# Altium footprint library 4.49-接插件.PcbLib: 260 footprints (part 4 of 17)
Each footprint in its own frame and in the unit in brackets; x right, y up, seen from the top. Pads: shape width x height; smd on the part's side, far side on the other; paste and mask are expansions set on the pad; w line width, h text height; cw(c..) or ccw(c..) is an arc to the next point about the centre after c.
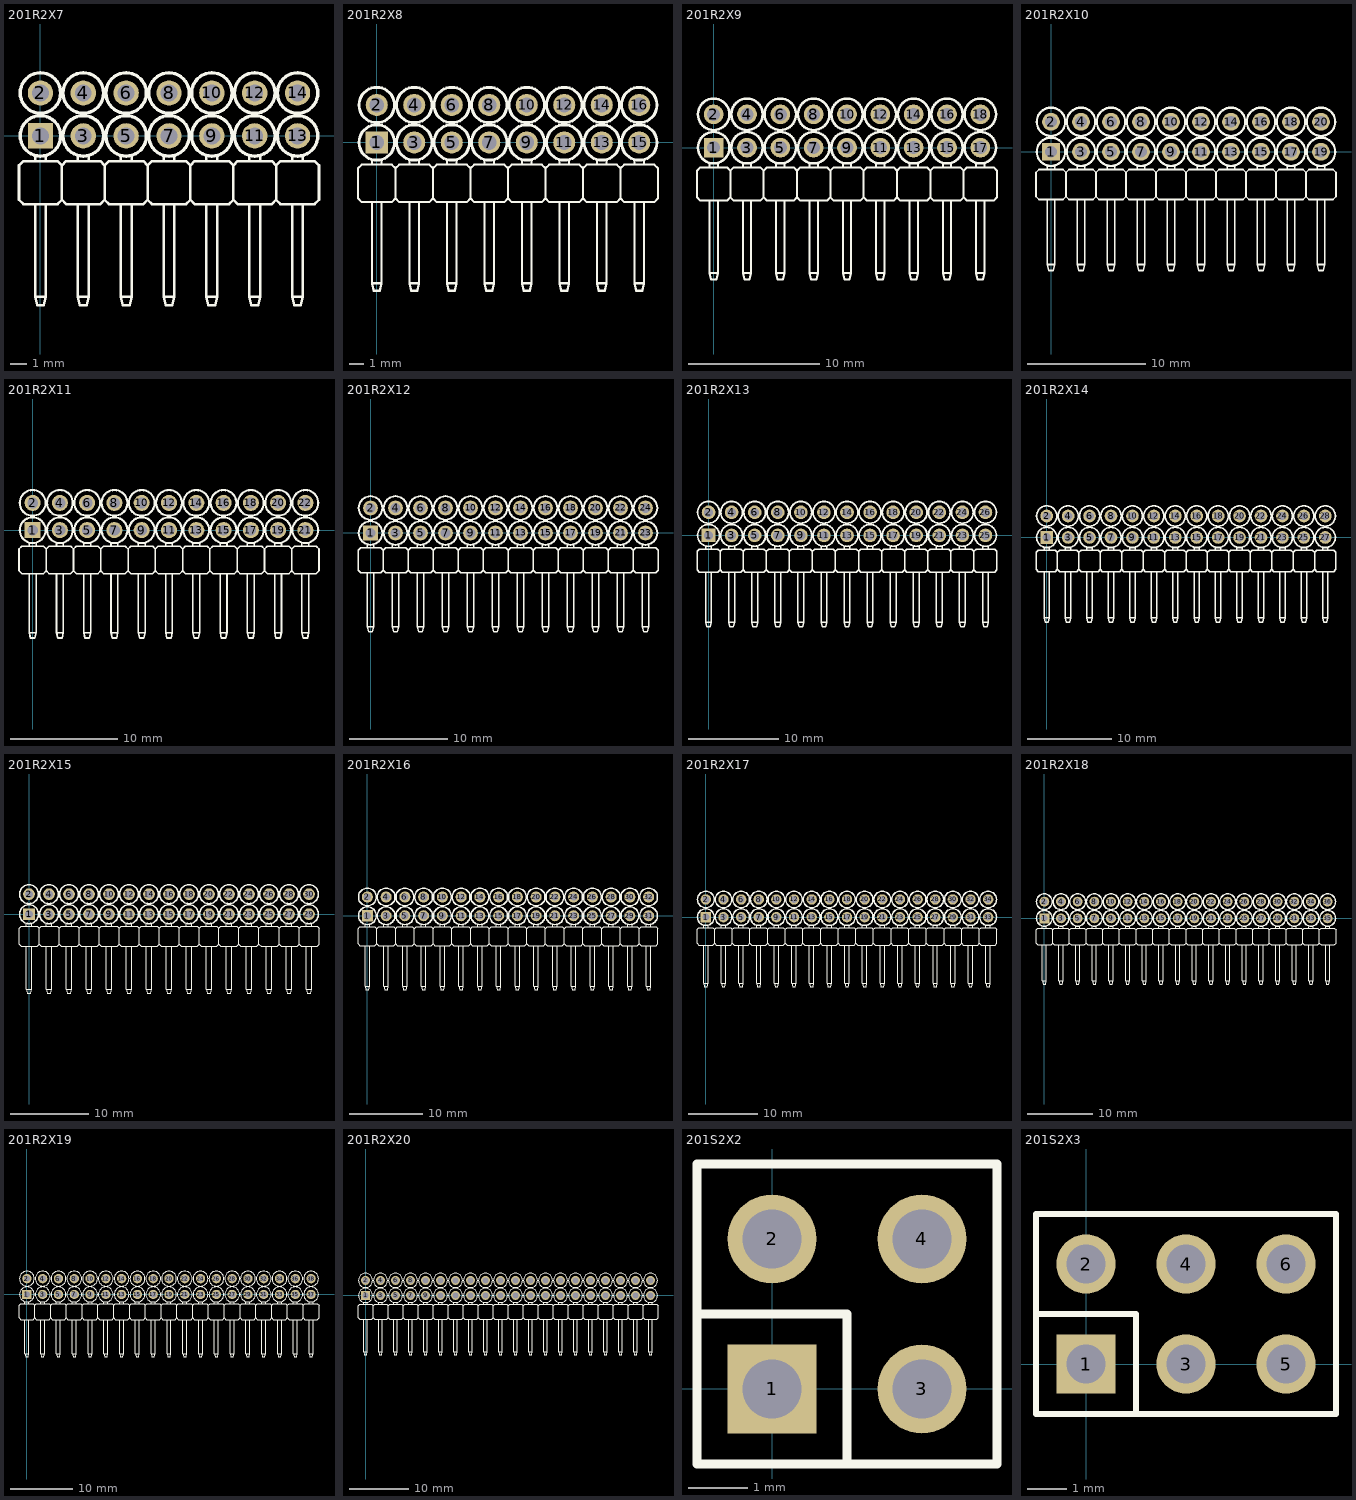
[diagram p3: the footprints below, top view; thin cyan lines are the x and y axes]

## 201R2X7 [mm]
pads (14):
  rect 1.5x1.5 hole 1: 1(0,0)
  round 1.5 hole 1: 2(0,2.54) 3(2.54,0) 4(2.54,2.54) 5(5.08,0) 6(5.08,2.54) 7(7.62,0) 8(7.62,2.54) 9(10.16,0) 10(10.16,2.54) 11(12.7,0) 12(12.7,2.54) 13(15.24,0) 14(15.24,2.54)
Top Overlay:
  circle w0.2: c15.24,2.54 r1.2
  circle w0.2: c15.24,0 r1.2
  circle w0.2: c12.7,0 r1.2
  circle w0.2: c12.7,2.54 r1.2
  circle w0.2: c10.16,2.54 r1.2
  circle w0.2: c10.16,0 r1.2
  circle w0.2: c7.62,0 r1.2
  circle w0.2: c2.54,0 r1.2
  circle w0.2: c0,0 r1.2
  circle w0.2: c5.08,0 r1.2
  circle w0.2: c5.08,2.54 r1.2
  circle w0.2: c0,2.54 r1.2
  circle w0.2: c2.54,2.54 r1.2
  circle w0.2: c7.62,2.54 r1.2
  lines w0.15: -0.32,-4.05 -0.32,-9.54 ; -0.32,-1.5 -0.32,-1.27 ; 0.32,-4.05 0.32,-9.54 ; 0.32,-1.5 0.32,-1.27 ; 2.22,-4.05 2.22,-9.54 ; 2.22,-1.5 2.22,-1.27 ; 2.86,-4.05 2.86,-9.54 ; 2.86,-1.5 2.86,-1.27 ; 4.76,-4.05 4.76,-9.54 ; 4.76,-1.5 4.76,-1.27 ; 5.4,-4.05 5.4,-9.54 ; 5.4,-1.5 5.4,-1.27 ; 7.3,-4.05 7.3,-9.54 ; 7.3,-1.5 7.3,-1.27 ; 7.94,-4.05 7.94,-9.54 ; 7.94,-1.5 7.94,-1.27 ; 9.84,-4.05 9.84,-9.54 ; 9.84,-1.5 9.84,-1.27 ; 10.48,-4.05 10.48,-9.54 ; 10.48,-1.5 10.48,-1.27 ; 12.38,-4.05 12.38,-9.54 ; 12.38,-1.5 12.38,-1.27 ; 13.02,-4.05 13.02,-9.54 ; 13.02,-1.5 13.02,-1.27 ; 14.92,-4.05 14.92,-9.54 ; 14.92,-1.5 14.92,-1.27 ; 15.56,-4.05 15.56,-9.54 ; 15.56,-1.5 15.56,-1.27 ; -0.32,-9.54 0.32,-9.54 ; -0.32,-9.54 -0.2,-10.04 0.2,-10.04 0.32,-9.54 ; 1.27,-3.786 1.27,-1.754 ; 1.27,-3.786 1.524,-4.04 3.556,-4.04 3.81,-3.786 ; 1.27,-3.786 1.016,-4.04 -1.016,-4.04 -1.27,-3.786 -1.27,-1.754 -1.016,-1.5 1.016,-1.5 1.27,-1.754 ; 1.27,-1.754 1.524,-1.5 3.556,-1.5 3.81,-1.754 ; 2.22,-9.54 2.34,-10.04 2.74,-10.04 2.86,-9.54 ; 2.22,-9.54 2.86,-9.54 ; 3.81,-3.786 4.064,-4.04 6.096,-4.04 6.35,-3.786 ; 3.81,-3.786 3.81,-1.754 ; 3.81,-1.754 4.064,-1.5 6.096,-1.5 6.35,-1.754 ; 4.76,-9.54 5.4,-9.54 ; 4.76,-9.54 4.88,-10.04 5.28,-10.04 5.4,-9.54 ; 6.35,-3.786 6.604,-4.04 8.636,-4.04 8.89,-3.786 ; 6.35,-3.786 6.35,-1.754 ; 6.35,-1.754 6.604,-1.5 8.636,-1.5 8.89,-1.754 ; 7.3,-9.54 7.94,-9.54 ; 7.3,-9.54 7.42,-10.04 7.82,-10.04 7.94,-9.54 ; 8.89,-3.786 8.89,-1.754 ; 8.89,-3.786 9.144,-4.04 11.176,-4.04 11.43,-3.786 ; 8.89,-1.754 9.144,-1.5 11.176,-1.5 11.43,-1.754 ; 9.84,-9.54 9.96,-10.04 10.36,-10.04 10.48,-9.54 ; 9.84,-9.54 10.48,-9.54 ; 11.43,-3.786 11.684,-4.04 13.716,-4.04 13.97,-3.786 ; 11.43,-3.786 11.43,-1.754 ; 11.43,-1.754 11.684,-1.5 13.716,-1.5 13.97,-1.754 ; 12.38,-9.54 13.02,-9.54 ; 12.38,-9.54 12.5,-10.04 12.9,-10.04 13.02,-9.54 ; 13.97,-3.786 14.224,-4.04 16.256,-4.04 16.51,-3.786 16.51,-1.754 16.256,-1.5 14.224,-1.5 13.97,-1.754 ; 13.97,-3.786 13.97,-1.754 ; 14.92,-9.54 15.56,-9.54 ; 14.92,-9.54 15.04,-10.04 15.44,-10.04 15.56,-9.54
3D body "201R7.STEP": height 5.08, standoff -1.73, extent -1.27,-10 16.51,2.855

## 201R2X8 [mm]
pads (16):
  rect 1.5x1.5 hole 1: 1(0,0)
  round 1.5 hole 1: 2(0,2.54) 3(2.54,0) 4(2.54,2.54) 5(5.08,0) 6(5.08,2.54) 7(7.62,0) 8(7.62,2.54) 9(10.16,0) 10(10.16,2.54) 11(12.7,0) 12(12.7,2.54) 13(15.24,0) 14(15.24,2.54) 15(17.78,0) 16(17.78,2.54)
Top Overlay:
  circle w0.2: c17.78,2.54 r1.2
  circle w0.2: c17.78,0 r1.2
  circle w0.2: c7.62,2.54 r1.2
  circle w0.2: c2.54,2.54 r1.2
  circle w0.2: c0,2.54 r1.2
  circle w0.2: c5.08,2.54 r1.2
  circle w0.2: c5.08,0 r1.2
  circle w0.2: c0,0 r1.2
  circle w0.2: c2.54,0 r1.2
  circle w0.2: c7.62,0 r1.2
  circle w0.2: c10.16,0 r1.2
  circle w0.2: c10.16,2.54 r1.2
  circle w0.2: c12.7,2.54 r1.2
  circle w0.2: c12.7,0 r1.2
  circle w0.2: c15.24,0 r1.2
  circle w0.2: c15.24,2.54 r1.2
  lines w0.15: -0.32,-4.05 -0.32,-9.54 ; -0.32,-1.5 -0.32,-1.27 ; 0.32,-4.05 0.32,-9.54 ; 0.32,-1.5 0.32,-1.27 ; 2.22,-4.05 2.22,-9.54 ; 2.22,-1.5 2.22,-1.27 ; 2.86,-4.05 2.86,-9.54 ; 2.86,-1.5 2.86,-1.27 ; 4.76,-4.05 4.76,-9.54 ; 4.76,-1.5 4.76,-1.27 ; 5.4,-4.05 5.4,-9.54 ; 5.4,-1.5 5.4,-1.27 ; 7.3,-4.05 7.3,-9.54 ; 7.3,-1.5 7.3,-1.27 ; 7.94,-4.05 7.94,-9.54 ; 7.94,-1.5 7.94,-1.27 ; 9.84,-4.05 9.84,-9.54 ; 9.84,-1.5 9.84,-1.27 ; 10.48,-4.05 10.48,-9.54 ; 10.48,-1.5 10.48,-1.27 ; 12.38,-4.05 12.38,-9.54 ; 12.38,-1.5 12.38,-1.27 ; 13.02,-4.05 13.02,-9.54 ; 13.02,-1.5 13.02,-1.27 ; 14.92,-4.05 14.92,-9.54 ; 14.92,-1.5 14.92,-1.27 ; 15.56,-4.05 15.56,-9.54 ; 15.56,-1.5 15.56,-1.27 ; 17.46,-4.05 17.46,-9.54 ; 17.46,-1.5 17.46,-1.27 ; 18.1,-4.05 18.1,-9.54 ; 18.1,-1.5 18.1,-1.27 ; -0.32,-9.54 -0.2,-10.04 0.2,-10.04 0.32,-9.54 ; -0.32,-9.54 0.32,-9.54 ; 1.27,-3.786 1.016,-4.04 -1.016,-4.04 -1.27,-3.786 -1.27,-1.754 -1.016,-1.5 1.016,-1.5 1.27,-1.754 ; 1.27,-3.786 1.524,-4.04 3.556,-4.04 3.81,-3.786 ; 1.27,-3.786 1.27,-1.754 ; 1.27,-1.754 1.524,-1.5 3.556,-1.5 3.81,-1.754 ; 2.22,-9.54 2.86,-9.54 ; 2.22,-9.54 2.34,-10.04 2.74,-10.04 2.86,-9.54 ; 3.81,-3.786 3.81,-1.754 ; 3.81,-3.786 4.064,-4.04 6.096,-4.04 6.35,-3.786 ; 3.81,-1.754 4.064,-1.5 6.096,-1.5 6.35,-1.754 ; 4.76,-9.54 4.88,-10.04 5.28,-10.04 5.4,-9.54 ; 4.76,-9.54 5.4,-9.54 ; 6.35,-3.786 6.35,-1.754 ; 6.35,-3.786 6.604,-4.04 8.636,-4.04 8.89,-3.786 ; 6.35,-1.754 6.604,-1.5 8.636,-1.5 8.89,-1.754 ; 7.3,-9.54 7.42,-10.04 7.82,-10.04 7.94,-9.54 ; 7.3,-9.54 7.94,-9.54 ; 8.89,-3.786 8.89,-1.754 ; 8.89,-3.786 9.144,-4.04 11.176,-4.04 11.43,-3.786 ; 8.89,-1.754 9.144,-1.5 11.176,-1.5 11.43,-1.754 ; 9.84,-9.54 9.96,-10.04 10.36,-10.04 10.48,-9.54 ; 9.84,-9.54 10.48,-9.54 ; 11.43,-3.786 11.684,-4.04 13.716,-4.04 13.97,-3.786 ; 11.43,-3.786 11.43,-1.754 ; 11.43,-1.754 11.684,-1.5 13.716,-1.5 13.97,-1.754 ; 12.38,-9.54 13.02,-9.54 ; 12.38,-9.54 12.5,-10.04 12.9,-10.04 13.02,-9.54 ; 13.97,-3.786 13.97,-1.754 ; 13.97,-3.786 14.224,-4.04 16.256,-4.04 16.51,-3.786 ; 13.97,-1.754 14.224,-1.5 16.256,-1.5 16.51,-1.754 ; 14.92,-9.54 15.04,-10.04 15.44,-10.04 15.56,-9.54 ; 14.92,-9.54 15.56,-9.54 ; 16.51,-3.786 16.51,-1.754 ; 16.51,-3.786 16.764,-4.04 18.796,-4.04 19.05,-3.786 19.05,-1.754 18.796,-1.5 16.764,-1.5 16.51,-1.754 ; 17.46,-9.54 17.58,-10.04 17.98,-10.04 18.1,-9.54 ; 17.46,-9.54 18.1,-9.54
3D body "201R8.STEP": height 5.08, standoff -1.73, extent -1.27,-10 19.05,2.855

## 201R2X9 [mm]
pads (18):
  rect 1.5x1.5 hole 1: 1(0,0)
  round 1.5 hole 1: 2(0,2.54) 3(2.54,0) 4(2.54,2.54) 5(5.08,0) 6(5.08,2.54) 7(7.62,0) 8(7.62,2.54) 9(10.16,0) 10(10.16,2.54) 11(12.7,0) 12(12.7,2.54) 13(15.24,0) 14(15.24,2.54) 15(17.78,0) 16(17.78,2.54) 17(20.32,0) 18(20.32,2.54)
Top Overlay:
  drawing of 154 lines, arcs and shapes, not listed
3D body "201R9.STEP": height 5.08, standoff -1.73, extent -1.27,-10 21.59,2.855

## 201R2X10 [mm]
pads (20):
  rect 1.5x1.5 hole 1: 1(0,0)
  round 1.5 hole 1: 2(0,2.54) 3(2.54,0) 4(2.54,2.54) 5(5.08,0) 6(5.08,2.54) 7(7.62,0) 8(7.62,2.54) 9(10.16,0) 10(10.16,2.54) 11(12.7,0) 12(12.7,2.54) 13(15.24,0) 14(15.24,2.54) 15(17.78,0) 16(17.78,2.54) 17(20.32,0) 18(20.32,2.54) 19(22.86,0) 20(22.86,2.54)
Top Overlay:
  drawing of 171 lines, arcs and shapes, not listed
3D body "201R10.STEP": height 5.08, standoff -1.73, extent -1.27,-10 24.13,2.855

## 201R2X11 [mm]
pads (22):
  rect 1.5x1.5 hole 1: 1(0,0)
  round 1.5 hole 1: 2(0,2.54) 3(2.54,0) 4(2.54,2.54) 5(5.08,0) 6(5.08,2.54) 7(7.62,0) 8(7.62,2.54) 9(10.16,0) 10(10.16,2.54) 11(12.7,0) 12(12.7,2.54) 13(15.24,0) 14(15.24,2.54) 15(17.78,0) 16(17.78,2.54) 17(20.32,0) 18(20.32,2.54) 19(22.86,0) 20(22.86,2.54) 21(25.4,0) 22(25.4,2.54)
Top Overlay:
  drawing of 188 lines, arcs and shapes, not listed
3D body "201R11.STEP": height 5.08, standoff -1.73, extent -1.27,-10 26.67,2.855

## 201R2X12 [mm]
pads (24):
  rect 1.5x1.5 hole 1: 1(0,0)
  round 1.5 hole 1: 2(0,2.54) 3(2.54,0) 4(2.54,2.54) 5(5.08,0) 6(5.08,2.54) 7(7.62,0) 8(7.62,2.54) 9(10.16,0) 10(10.16,2.54) 11(12.7,0) 12(12.7,2.54) 13(15.24,0) 14(15.24,2.54) 15(17.78,0) 16(17.78,2.54) 17(20.32,0) 18(20.32,2.54) 19(22.86,0) 20(22.86,2.54) 21(25.4,0) 22(25.4,2.54) 23(27.94,0) 24(27.94,2.54)
Top Overlay:
  drawing of 205 lines, arcs and shapes, not listed
3D body "201R.STEP": height 5.08, standoff -1.73, extent -1.27,-10 29.21,2.855

## 201R2X13 [mm]
pads (26):
  rect 1.5x1.5 hole 1: 1(0,0)
  round 1.5 hole 1: 2(0,2.54) 3(2.54,0) 4(2.54,2.54) 5(5.08,0) 6(5.08,2.54) 7(7.62,0) 8(7.62,2.54) 9(10.16,0) 10(10.16,2.54) 11(12.7,0) 12(12.7,2.54) 13(15.24,0) 14(15.24,2.54) 15(17.78,0) 16(17.78,2.54) 17(20.32,0) 18(20.32,2.54) 19(22.86,0) 20(22.86,2.54) 21(25.4,0) 22(25.4,2.54) 23(27.94,0) 24(27.94,2.54) 25(30.48,0) 26(30.48,2.54)
Top Overlay:
  drawing of 224 lines, arcs and shapes, not listed
3D body "201R.STEP": height 5.08, standoff -1.73, extent -1.27,-10 31.75,2.855

## 201R2X14 [mm]
pads (28):
  rect 1.5x1.5 hole 1: 1(0,0)
  round 1.5 hole 1: 2(0,2.54) 3(2.54,0) 4(2.54,2.54) 5(5.08,0) 6(5.08,2.54) 7(7.62,0) 8(7.62,2.54) 9(10.16,0) 10(10.16,2.54) 11(12.7,0) 12(12.7,2.54) 13(15.24,0) 14(15.24,2.54) 15(17.78,0) 16(17.78,2.54) 17(20.32,0) 18(20.32,2.54) 19(22.86,0) 20(22.86,2.54) 21(25.4,0) 22(25.4,2.54) 23(27.94,0) 24(27.94,2.54) 25(30.48,0) 26(30.48,2.54) 27(33.02,0) 28(33.02,2.54)
Top Overlay:
  drawing of 243 lines, arcs and shapes, not listed
3D body "201R.STEP": height 5.08, standoff -1.73, extent -1.27,-10 34.29,2.855

## 201R2X15 [mm]
pads (30):
  rect 1.5x1.5 hole 1: 1(0,0)
  round 1.5 hole 1: 2(0,2.54) 3(2.54,0) 4(2.54,2.54) 5(5.08,0) 6(5.08,2.54) 7(7.62,0) 8(7.62,2.54) 9(10.16,0) 10(10.16,2.54) 11(12.7,0) 12(12.7,2.54) 13(15.24,0) 14(15.24,2.54) 15(17.78,0) 16(17.78,2.54) 17(20.32,0) 18(20.32,2.54) 19(22.86,0) 20(22.86,2.54) 21(25.4,0) 22(25.4,2.54) 23(27.94,0) 24(27.94,2.54) 25(30.48,0) 26(30.48,2.54) 27(33.02,0) 28(33.02,2.54) 29(35.56,0) 30(35.56,2.54)
Top Overlay:
  drawing of 262 lines, arcs and shapes, not listed
3D body "201R.STEP": height 5.08, standoff -1.73, extent -1.27,-10 36.83,2.855

## 201R2X16 [mm]
pads (32):
  rect 1.5x1.5 hole 1: 1(0,0)
  round 1.5 hole 1: 2(0,2.54) 3(2.54,0) 4(2.54,2.54) 5(5.08,0) 6(5.08,2.54) 7(7.62,0) 8(7.62,2.54) 9(10.16,0) 10(10.16,2.54) 11(12.7,0) 12(12.7,2.54) 13(15.24,0) 14(15.24,2.54) 15(17.78,0) 16(17.78,2.54) 17(20.32,0) 18(20.32,2.54) 19(22.86,0) 20(22.86,2.54) 21(25.4,0) 22(25.4,2.54) 23(27.94,0) 24(27.94,2.54) 25(30.48,0) 26(30.48,2.54) 27(33.02,0) 28(33.02,2.54) 29(35.56,0) 30(35.56,2.54) 31(38.1,0) 32(38.1,2.54)
Top Overlay:
  drawing of 283 lines, arcs and shapes, not listed
3D body "201R.STEP": height 5.08, standoff -1.73, extent -1.27,-10 39.37,2.855

## 201R2X17 [mm]
pads (34):
  rect 1.5x1.5 hole 1: 1(0,0)
  round 1.5 hole 1: 2(0,2.54) 3(2.54,0) 4(2.54,2.54) 5(5.08,0) 6(5.08,2.54) 7(7.62,0) 8(7.62,2.54) 9(10.16,0) 10(10.16,2.54) 11(12.7,0) 12(12.7,2.54) 13(15.24,0) 14(15.24,2.54) 15(17.78,0) 16(17.78,2.54) 17(20.32,0) 18(20.32,2.54) 19(22.86,0) 20(22.86,2.54) 21(25.4,0) 22(25.4,2.54) 23(27.94,0) 24(27.94,2.54) 25(30.48,0) 26(30.48,2.54) 27(33.02,0) 28(33.02,2.54) 29(35.56,0) 30(35.56,2.54) 31(38.1,0) 32(38.1,2.54) 33(40.64,0) 34(40.64,2.54)
Top Overlay:
  drawing of 305 lines, arcs and shapes, not listed
3D body "201R.STEP": height 5.08, standoff -1.73, extent -1.27,-10 41.91,2.855

## 201R2X18 [mm]
pads (36):
  rect 1.5x1.5 hole 1: 1(0,0)
  round 1.5 hole 1: 2(0,2.54) 3(2.54,0) 4(2.54,2.54) 5(5.08,0) 6(5.08,2.54) 7(7.62,0) 8(7.62,2.54) 9(10.16,0) 10(10.16,2.54) 11(12.7,0) 12(12.7,2.54) 13(15.24,0) 14(15.24,2.54) 15(17.78,0) 16(17.78,2.54) 17(20.32,0) 18(20.32,2.54) 19(22.86,0) 20(22.86,2.54) 21(25.4,0) 22(25.4,2.54) 23(27.94,0) 24(27.94,2.54) 25(30.48,0) 26(30.48,2.54) 27(33.02,0) 28(33.02,2.54) 29(35.56,0) 30(35.56,2.54) 31(38.1,0) 32(38.1,2.54) 33(40.64,0) 34(40.64,2.54) 35(43.18,0) 36(43.18,2.54)
Top Overlay:
  drawing of 328 lines, arcs and shapes, not listed
3D body "201R.STEP": height 5.08, standoff -1.73, extent -1.27,-10 44.45,2.855

## 201R2X19 [mm]
pads (38):
  rect 1.5x1.5 hole 1: 1(0,0)
  round 1.5 hole 1: 2(0,2.54) 3(2.54,0) 4(2.54,2.54) 5(5.08,0) 6(5.08,2.54) 7(7.62,0) 8(7.62,2.54) 9(10.16,0) 10(10.16,2.54) 11(12.7,0) 12(12.7,2.54) 13(15.24,0) 14(15.24,2.54) 15(17.78,0) 16(17.78,2.54) 17(20.32,0) 18(20.32,2.54) 19(22.86,0) 20(22.86,2.54) 21(25.4,0) 22(25.4,2.54) 23(27.94,0) 24(27.94,2.54) 25(30.48,0) 26(30.48,2.54) 27(33.02,0) 28(33.02,2.54) 29(35.56,0) 30(35.56,2.54) 31(38.1,0) 32(38.1,2.54) 33(40.64,0) 34(40.64,2.54) 35(43.18,0) 36(43.18,2.54) 37(45.72,0) 38(45.72,2.54)
Top Overlay:
  drawing of 352 lines, arcs and shapes, not listed
3D body "201R.STEP": height 5.08, standoff -1.73, extent -1.27,-10 46.99,2.855

## 201R2X20 [mm]
pads (40):
  rect 1.5x1.5 hole 1: 1(0,0)
  round 1.5 hole 1: 2(0,2.54) 3(2.54,0) 4(2.54,2.54) 5(5.08,0) 6(5.08,2.54) 7(7.62,0) 8(7.62,2.54) 9(10.16,0) 10(10.16,2.54) 11(12.7,0) 12(12.7,2.54) 13(15.24,0) 14(15.24,2.54) 15(17.78,0) 16(17.78,2.54) 17(20.32,0) 18(20.32,2.54) 19(22.86,0) 20(22.86,2.54) 21(25.4,0) 22(25.4,2.54) 23(27.94,0) 24(27.94,2.54) 25(30.48,0) 26(30.48,2.54) 27(33.02,0) 28(33.02,2.54) 29(35.56,0) 30(35.56,2.54) 31(38.1,0) 32(38.1,2.54) 33(40.64,0) 34(40.64,2.54) 35(43.18,0) 36(43.18,2.54) 37(45.72,0) 38(45.72,2.54) 39(48.26,0) 40(48.26,2.54)
Top Overlay:
  drawing of 377 lines, arcs and shapes, not listed
3D body "201R.STEP": height 5.08, standoff -1.73, extent -1.27,-10 49.53,2.855

## 201S2X2 [mm]
pads (4):
  rect 1.5x1.5 hole 1: 1(0,0)
  round 1.5 hole 1: 2(0,2.54) 3(2.54,0) 4(2.54,2.54)
Top Overlay:
  lines w0.15: -1.27,1.27 1.27,1.27 1.27,-1.27 ; -1.27,-1.27 -1.27,3.81 3.81,3.81 3.81,-1.27 -1.27,-1.27
3D body "User Library-PLD-4.step": height 8.54, standoff -3, extent -1.27,-1.27 3.81,3.81

## 201S2X3 [mm]
pads (6):
  rect 1.5x1.5 hole 1: 1(0,0)
  round 1.5 hole 1: 2(0,2.54) 3(2.54,0) 4(2.54,2.54) 5(5.08,0) 6(5.08,2.54)
Top Overlay:
  lines w0.15: -1.27,1.27 1.27,1.27 1.27,-1.27 ; -1.27,-1.27 6.35,-1.27 6.35,3.81 -1.27,3.81 -1.27,-1.27
3D body "User Library-PLD-6.step": height 8.4, standoff -3, extent -1.27,-1.23 6.35,3.77